# Altium footprint library XU-GENARAL PCB .PcbLib: 1176 footprints (part 15 of 75)
Each footprint in its own frame and in the unit in brackets; x right, y up, seen from the top. Pads: shape width x height; smd on the part's side, far side on the other; paste and mask are expansions set on the pad; w line width, h text height; cw(c..) or ccw(c..) is an arc to the next point about the centre after c.
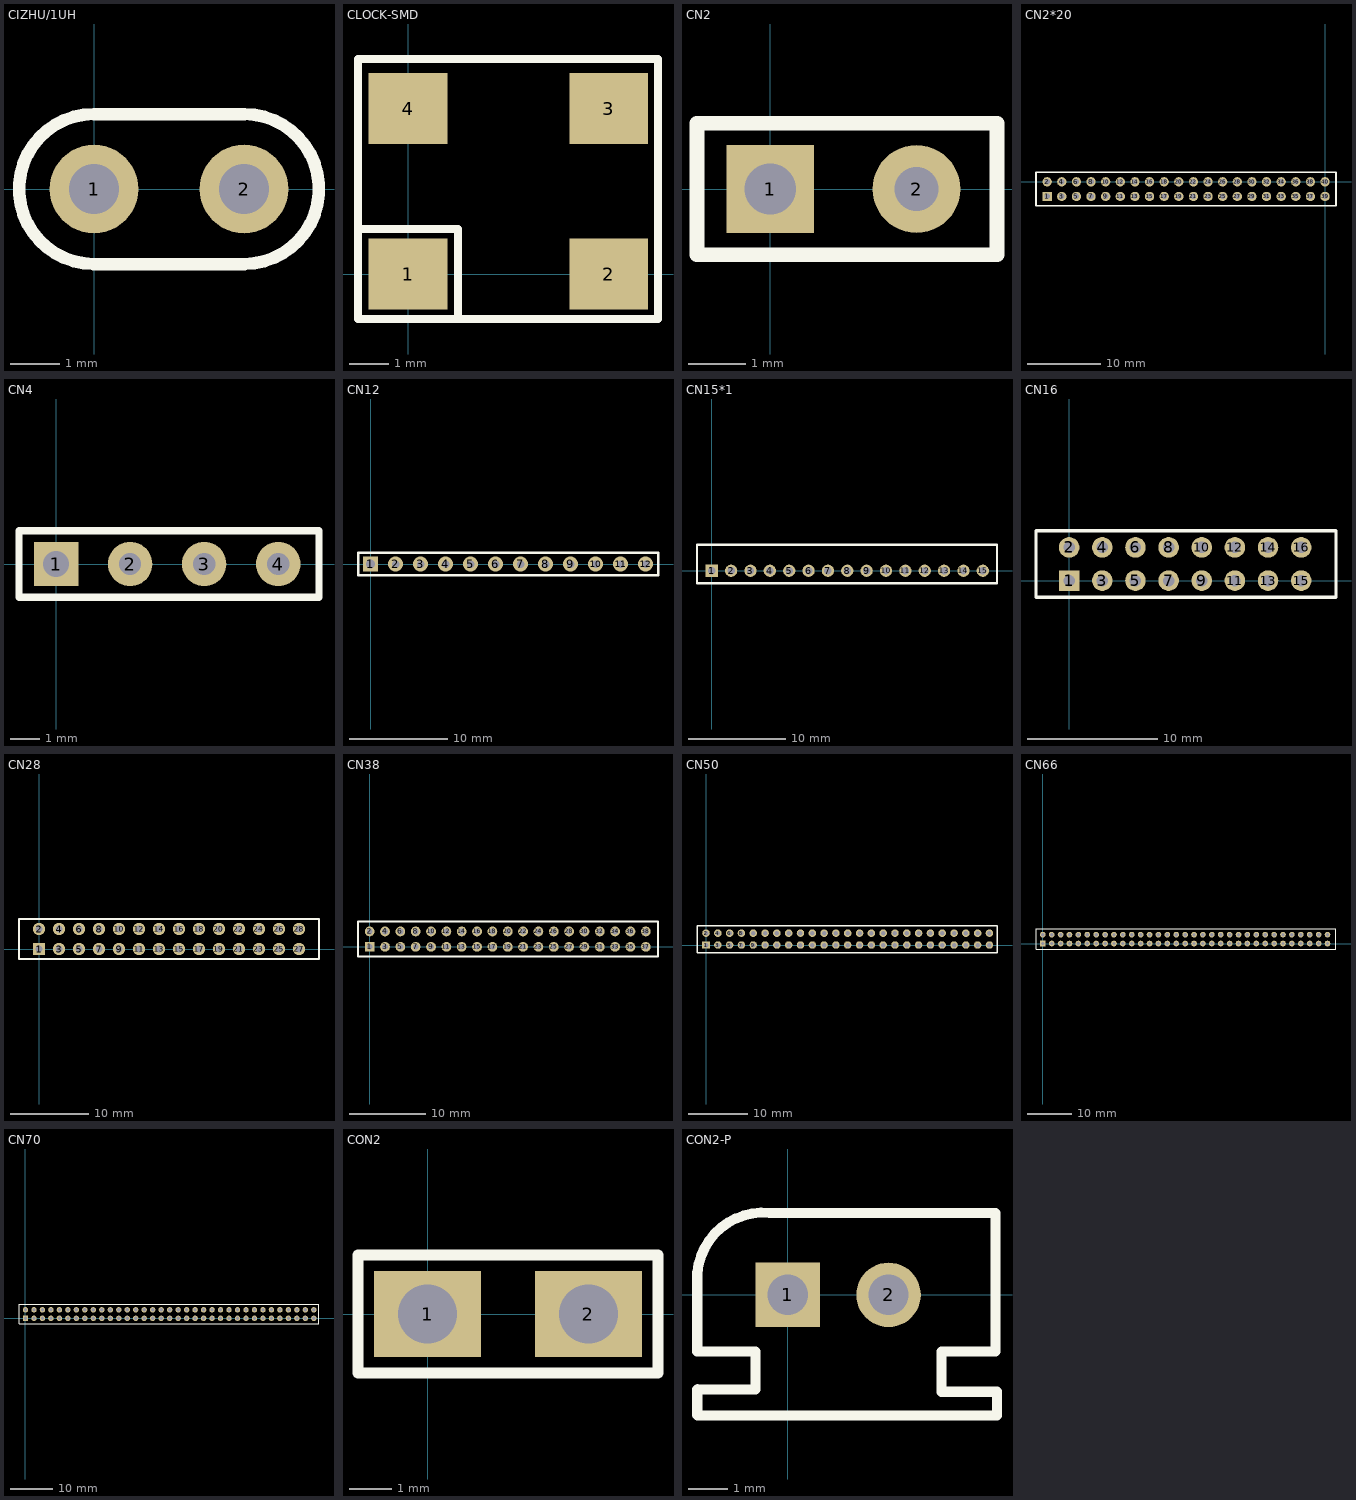
[diagram p14: the footprints below, top view; thin cyan lines are the x and y axes]

## CIZHU/1UH [mm]
pads (2):
  round 1.8 hole 1.016: 1(0,0) 2(3.048,0)
Top Overlay:
  lines w0.254: 0,-1.524 cw(c0,0) 0,1.524 3.048,1.524 cw(c3.048,0) 3.048,-1.524 0,-1.524

## CLOCK-SMD [mm]
height 1.1
pads (4):
  rect 2x1.8 smd: 1(0,0) 2(5.1,0) 3(5.1,4.2) 4(0,4.2)
Top Overlay:
  lines w0.203: -1.27,1.143 1.27,1.143 1.27,-1.143 ; -1.27,-1.143 6.35,-1.143 6.35,5.461 -1.27,5.461 -1.27,-1.143

## CN2 [mil]
pads (2):
  rect 60x60 hole 35: 1(0,0)
  round 60 hole 30: 2(100,0)
Top Overlay:
  lines w10: -50,-45 -50,45 155,45 155,-45 -50,-45

## CN2*20 [mm]
pads (40):
  rect 1.27x1.27 hole 0.762: 1(-38,-2)
  round 1.27 hole 0.762: 2(-38,0) 3(-36,-2) 4(-36,0) 5(-34,-2) 6(-34,0) 7(-32,-2) 8(-32,0) 9(-30,-2) 10(-30,0) 11(-28,-2) 12(-28,0) 13(-26,-2) 14(-26,0) 15(-24,-2) 16(-24,0) 17(-22,-2) 18(-22,0) 19(-20,-2) 20(-20,0) 21(-18,-2) 22(-18,0) 23(-16,-2) 24(-16,0) 25(-14,-2) 26(-14,0) 27(-12,-2) 28(-12,0) 29(-10,-2) 30(-10,0) 31(-8,-2) 32(-8,0) 33(-6,-2) 34(-6,0) 35(-4,-2) 36(-4,0) 37(-2,-2) 38(-2,0) 39(0,-2) 40(0,0)
Top Overlay:
  lines w0.254: -39.524,-3.27 -39.524,1.302 1.497,1.302 1.497,-3.27 -39.524,-3.27

## CN2_2.0 [mil]

## CN4 [mil]
pads (4):
  rect 60x60 hole 35: 1(0,0)
  round 60 hole 30: 2(100,0) 3(200,0) 4(300,0)
Top Overlay:
  lines w10: -50,-45 -50,45 355,45 355,-45 -50,-45

## CN12 [mil]
pads (12):
  rect 60x60 hole 35: 1(0,0)
  round 60 hole 30: 2(100,0) 3(200,0) 4(300,0) 5(400,0) 6(500,0) 7(600,0) 8(700,0) 9(800,0) 10(900,0) 11(1000,0) 12(1100,0)
Top Overlay:
  lines w10: -50,-45 -50,45 1150,45 1150,-45 -50,-45

## CN15*1 [mil]
pads (15):
  rect 50x50 hole 30: 1(0,0)
  round 50 hole 30: 2(78.74,0) 3(157.48,0) 4(236.22,0) 5(314.96,0) 6(393.7,0) 7(472.44,0) 8(551.18,0) 9(629.92,0) 10(708.66,0) 11(787.4,0) 12(866.14,0) 13(944.88,0) 14(1023.62,0) 15(1102.36,0)
Top Overlay:
  lines w10: -60,-50 1160,-50 1160,105 -60,105 -60,-50

## CN16 [mil]
pads (16):
  rect 62x62 hole 35: 1(0,0)
  round 62 hole 35: 2(0,100) 3(100,0) 4(100,100) 5(200,0) 6(200,100) 7(300,0) 8(300,100) 9(400,0) 10(400,100) 11(500,0) 12(500,100) 13(600,0) 14(600,100) 15(700,0) 16(700,100)
Top Overlay:
  lines w10: -100,-50 805,-50 805,150 -100,150 -100,-50

## CN28 [mil]
height 43.31
pads (28):
  rect 62x62 hole 35: 1(0,0)
  round 62 hole 35: 2(0,100) 3(100,0) 4(100,100) 5(200,0) 6(200,100) 7(300,0) 8(300,100) 9(400,0) 10(400,100) 11(500,0) 12(500,100) 13(600,0) 14(600,100) 15(700,0) 16(700,100) 17(800,0) 18(800,100) 19(900,0) 20(900,100) 21(1000,0) 22(1000,100) 23(1100,0) 24(1100,100) 25(1200,0) 26(1200,100) 27(1300,0) 28(1300,100)
Top Overlay:
  lines w10: -100,-50 1400,-50 1400,150 -100,150 -100,-50

## CN38 [mm]
pads (38):
  rect 1.27x1.27 hole 0.762: 1(0,0)
  round 1.27 hole 0.762: 2(0,2) 3(2,0) 4(2,2) 5(4,0) 6(4,2) 7(6,0) 8(6,2) 9(8,0) 10(8,2) 11(10,0) 12(10,2) 13(12,0) 14(12,2) 15(14,0) 16(14,2) 17(16,0) 18(16,2) 19(18,0) 20(18,2) 21(20,0) 22(20,2) 23(22,0) 24(22,2) 25(24,0) 26(24,2) 27(26,0) 28(26,2) 29(28,0) 30(28,2) 31(30,0) 32(30,2) 33(32,0) 34(32,2) 35(34,0) 36(34,2) 37(36,0) 38(36,2)
Top Overlay:
  lines w0.254: -1.524,-1.27 37.592,-1.27 37.592,3.302 -1.524,3.302 -1.524,-1.27

## CN50 [mm]
pads (50):
  rect 1.27x1.27 hole 0.762: 1(0,0)
  round 1.27 hole 0.762: 2(0,2) 3(2,0) 4(2,2) 5(4,0) 6(4,2) 7(6,0) 8(6,2) 9(8,0) 10(8,2) 11(10,0) 12(10,2) 13(12,0) 14(12,2) 15(14,0) 16(14,2) 17(16,0) 18(16,2) 19(18,0) 20(18,2) 21(20,0) 22(20,2) 23(22,0) 24(22,2) 25(24,0) 26(24,2) 27(26,0) 28(26,2) 29(28,0) 30(28,2) 31(30,0) 32(30,2) 33(32,0) 34(32,2) 35(34,0) 36(34,2) 37(36,0) 38(36,2) 39(38,0) 40(38,2) 41(40,0) 42(40,2) 43(42,0) 44(42,2) 45(44,0) 46(44,2) 47(46,0) 48(46,2) 49(48,0) 50(48,2)
Top Overlay:
  lines w0.254: -1.524,-1.27 -1.524,3.302 49.276,3.302 49.276,-1.27 -1.524,-1.27

## CN66 [mm]
pads (66):
  rect 1.27x1.27 hole 0.762: 1(0,0)
  round 1.27 hole 0.762: 2(0,2) 3(2,0) 4(2,2) 5(4,0) 6(4,2) 7(6,0) 8(6,2) 9(8,0) 10(8,2) 11(10,0) 12(10,2) 13(12,0) 14(12,2) 15(14,0) 16(14,2) 17(16,0) 18(16,2) 19(18,0) 20(18,2) 21(20,0) 22(20,2) 23(22,0) 24(22,2) 25(24,0) 26(24,2) 27(26,0) 28(26,2) 29(28,0) 30(28,2) 31(30,0) 32(30,2) 33(32,0) 34(32,2) 35(34,0) 36(34,2) 37(36,0) 38(36,2) 39(38,0) 40(38,2) 41(40,0) 42(40,2) 43(42,0) 44(42,2) 45(44,0) 46(44,2) 47(46,0) 48(46,2) 49(48,0) 50(48,2) 51(50,0) 52(50,2) 53(52,0) 54(52,2) 55(54,0) 56(54,2) 57(56,0) 58(56,2) 59(58,0) 60(58,2) 61(60,0) 62(60,2) 63(62,0) 64(62,2) 65(64,0) 66(64,2)
Top Overlay:
  lines w0.254: -1.524,-1.27 65.913,-1.27 65.913,3.302 -1.524,3.302 -1.524,-1.27

## CN70 [mm]
pads (70):
  rect 1.27x1.27 hole 0.762: 1(0,0)
  round 1.27 hole 0.762: 2(0,2) 3(2,0) 4(2,2) 5(4,0) 6(4,2) 7(6,0) 8(6,2) 9(8,0) 10(8,2) 11(10,0) 12(10,2) 13(12,0) 14(12,2) 15(14,0) 16(14,2) 17(16,0) 18(16,2) 19(18,0) 20(18,2) 21(20,0) 22(20,2) 23(22,0) 24(22,2) 25(24,0) 26(24,2) 27(26,0) 28(26,2) 29(28,0) 30(28,2) 31(30,0) 32(30,2) 33(32,0) 34(32,2) 35(34,0) 36(34,2) 37(36,0) 38(36,2) 39(38,0) 40(38,2) 41(40,0) 42(40,2) 43(42,0) 44(42,2) 45(44,0) 46(44,2) 47(46,0) 48(46,2) 49(48,0) 50(48,2) 51(50,0) 52(50,2) 53(52,0) 54(52,2) 55(54,0) 56(54,2) 57(56,0) 58(56,2) 59(58,0) 60(58,2) 61(60,0) 62(60,2) 63(62,0) 64(62,2) 65(64,0) 66(64,2) 67(66,0) 68(66,2) 69(68,0) 70(68,2)
Top Overlay:
  lines w0.254: -1.524,-1.27 69.215,-1.27 69.215,3.302 -1.524,3.302 -1.524,-1.27

## CON2 [mil]
pads (2):
  rect 100x80 hole 55: 1(0,0) 2(150,0)
Top Overlay:
  lines w10: -65,-55 215,-55 215,55 -65,55 -65,-55

## CON2-P [mil]
pads (2):
  rect 64x64 hole 40: 1(0,0)
  round 64 hole 40: 2(100,0)
Top Overlay:
  lines w5: -89.6,-91.12 -89.6,-119.23 -89.3,-119.53 207.54,-119.53 207.25,-119.24
  lines w10: -89.6,-56.32 -31.96,-56.32 -31.96,-93.4 -31.7,-93.66 -89.6,-93.66 -89.6,-119.23 ; -89.6,-54.8 -89.6,21.91 cw(c-24.12,15.78) -17.99,81.26 204.07,81.26 ; 146,81.26 159.72,81.26 205.92,81.26 ; 152.47,-56.72 152.47,-96.09 207.54,-96.09 207.54,-119.53 -89.3,-119.53 ; 152.47,-56.32 205.92,-56.32 205.92,79.4 ; -89.6,-119.23 -89.3,-119.53 ; -89.6,-119.23 -89.3,-119.53